# Altium footprint library NinjaPCB.PcbLib: 20 footprints (part 1 of 2)
Each footprint in its own frame and in the unit in brackets; x right, y up, seen from the top. Pads: shape width x height; smd on the part's side, far side on the other; paste and mask are expansions set on the pad; w line width, h text height; cw(c..) or ccw(c..) is an arc to the next point about the centre after c.
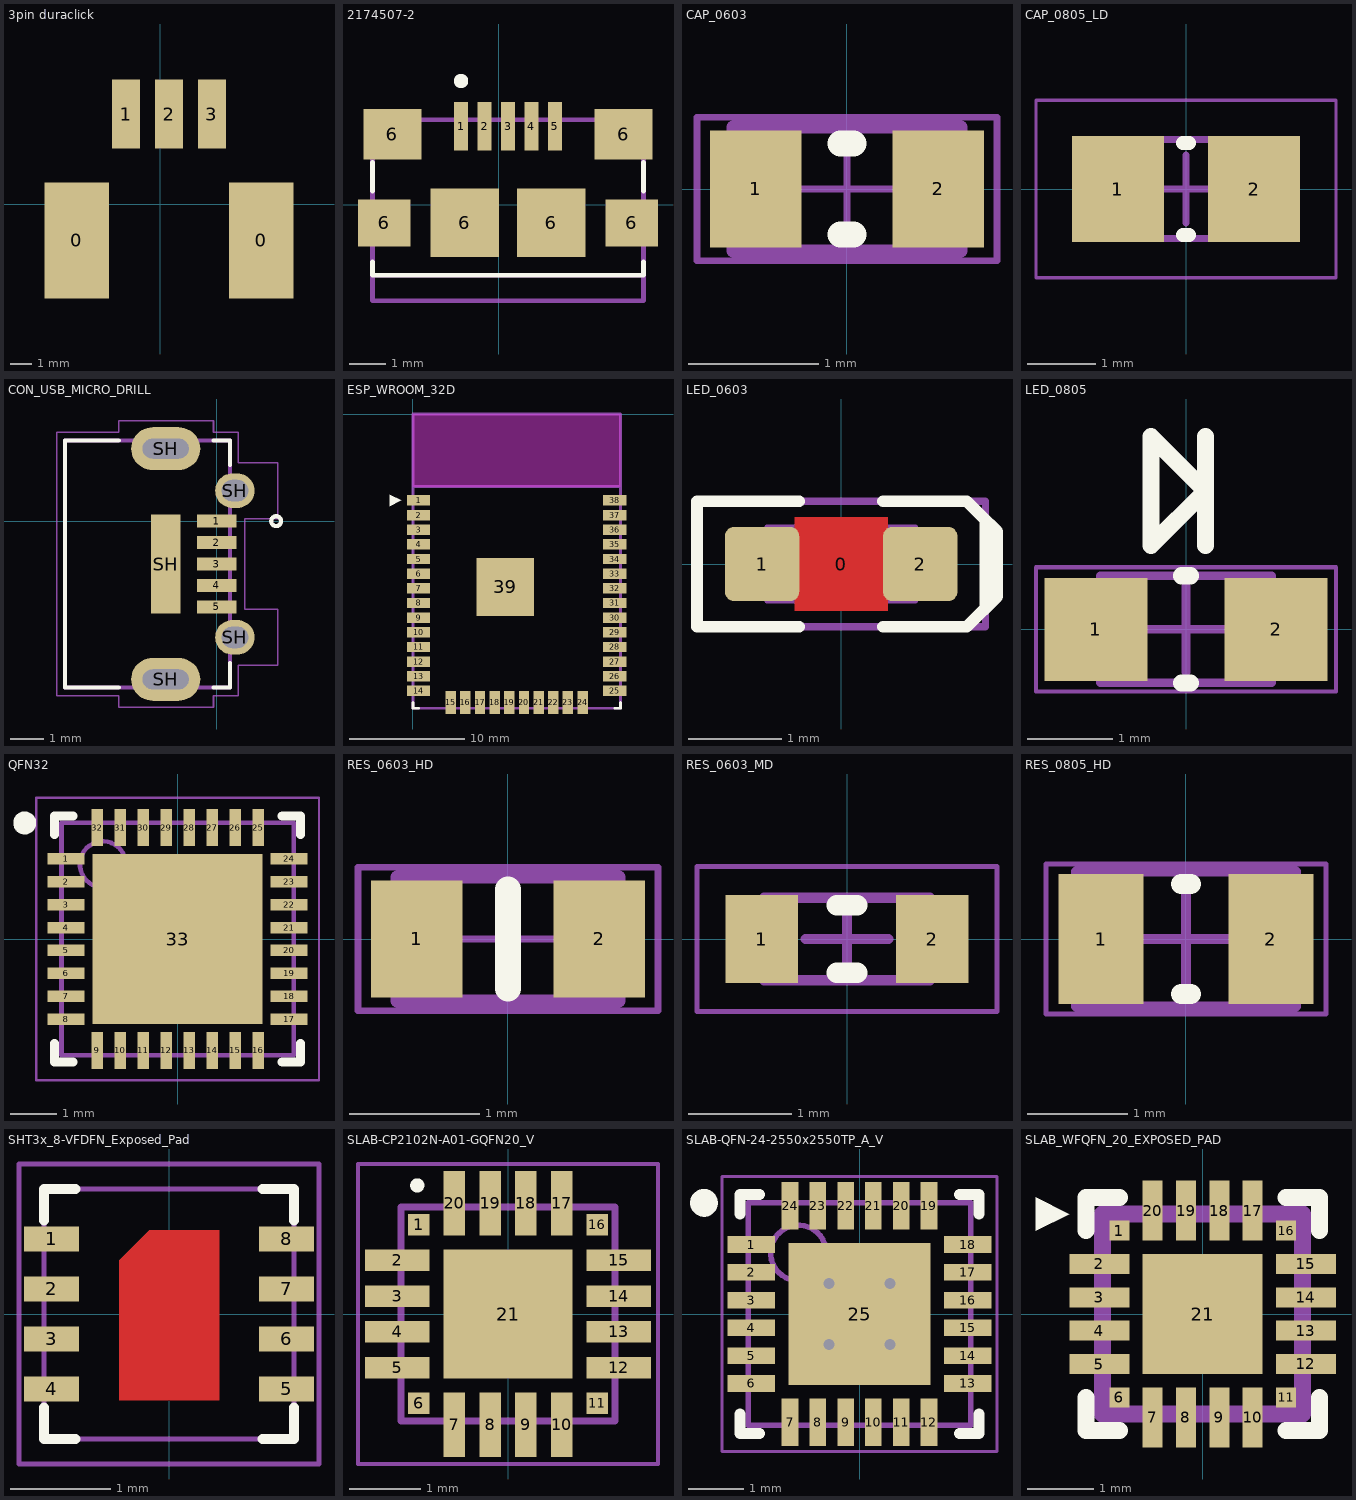
[diagram p0: the footprints below, top view; thin cyan lines are the x and y axes]

## 3pin duraclick [mm] "3pin molex duraclick system, black"
pads (5):
  rect 3x5.4 smd: 0(-3.9,-1.7) 0(4.7,-1.7)
  rect 1.3x3.2 smd: 1(-1.6,4.2) 2(0.4,4.2) 3(2.4,4.2)
3D body "3pin.stp": height 6.35, standoff -0.05, extent -4.6,-4.2 5.4,5.2

## 2174507-2 [mm]
pads (11):
  rect 0.4x1.35 smd: 1(-1.046,2.167) 2(-0.396,2.167) 3(0.254,2.167) 4(0.904,2.167) 5(1.554,2.167)
  rect 1.45x1.3 smd: 6(-3.171,-0.508) 6(3.679,-0.508)
  rect 1.6x1.4 smd: 6(-2.946,1.942) 6(3.454,1.942)
  rect 1.9x1.9 smd: 6(-0.946,-0.508) 6(1.454,-0.508)
Top Overlay:
  circle w0.2: c-1.046,3.417 r0.1
  lines w0.127: -3.496,-1.583 -3.496,-1.958 4.004,-1.958 4.004,-1.583 ; -3.496,0.367 -3.496,1.167 ; 4.004,0.367 4.004,1.167
Mechanical 1:
  lines w0.127: -3.496,-1.958 4.004,-1.958 ; -3.496,-1.958 -3.496,2.342 4.004,2.342 4.004,-1.958 ; -3.496,-1.958 -3.496,-2.658 4.004,-2.658 4.004,-1.958
  text "PCB EDGE" at -0.652,-2.128 h1.88
3D body "2174507-2.stp": height 2.68, standoff -0.02, extent -3.671,-2.642 4.129,2.358

## CAP_0603 [mm] "Ceramic"
pads (2):
  rect 0.7x0.9 smd: 1(-0.7,0) 2(0.7,0)
Top Overlay:
  lines w0.2: -0.05,-0.35 0.05,-0.35 ; -0.05,0.35 0.05,0.35
Top:
  lines w0.1: -0.875,-0.475 -0.875,0.475 0.875,0.475 0.875,-0.475 -0.875,-0.475
Mechanical 15:
  lines w0.05: -0.475,0 0.475,0 ; 0,-0.475 0,0.475 ; -1.15,-0.55 -1.15,0.55 1.15,0.55 1.15,-0.55 -1.15,-0.55
3D body "cap_0603_lowprofile.step": height 0.6, standoff 0, extent -0.8,-0.4 0.8,0.4

## CAP_0805_LD [mm] "Chip Capacitor, Body 2.0x1.2mm, Height 1.0mm, IPC Low Density"
height 1
pads (2):
  rect 1.35x1.55 smd: 1(-1,0) 2(1,0)
Top Overlay:
  lines w0.2: -0.05,-0.675 0.05,-0.675 ; -0.05,0.675 0.05,0.675
Top:
  lines w0.1: -1.1,-0.725 -1.1,0.725 1.1,0.725 1.1,-0.725 -1.1,-0.725
Mechanical 15:
  lines w0.05: -2.2,-1.3 -2.2,1.3 2.2,1.3 2.2,-1.3 -2.2,-1.3
  lines w0.1: -0.5,0 0.5,0 ; 0,-0.5 0,0.5
3D body: height 1, standoff 0, extent -0.6,-0.725 0.6,0.725
3D body: height 1, standoff 0, extent -1.1,-0.725 -0.6,0.725
3D body: height 1, standoff 0, extent 0.6,-0.725 1.1,0.725

## CON_USB_MICRO_DRILL [mm] "UJ2-MIBH2-4-SMT"
height 2.45
pads (10):
  rect 1.2x0.4 smd: 1(0,0) 2(0,-0.65) 3(0,-1.3) 4(0,-1.95) 5(0,-2.6)
  oval 2.1x1.3 hole 0.6 slot 1.4 at 0 deg: SH(-1.55,-4.8) SH(-1.55,2.2)
  rect 0.9x3 smd: SH(-1.55,-1.3)
  oval 1.2x1.05 hole 0.65 slot 0.8 at 0 deg: SH(0.55,-3.525) SH(0.55,0.925)
Top Overlay:
  circle w0.127: c1.8,0 r0.15
  lines w0.127: -2.975,-5.05 -4.6,-5.05 -4.6,2.45 -2.975,2.45 ; -0.1,-5.05 0.4,-5.05 0.4,-4.3 ; -0.1,2.45 0.4,2.45 0.4,1.7
Mechanical 1:
  circle w0.16: c-0.15,0 r0.08
  lines w0.127: -4.6,-5.05 0.4,-5.05 0.4,2.45 -4.6,2.45 -4.6,-5.05
Mechanical 4:
  lines w0: -1.95,-5.1 cw(c-1.95,-4.8) -1.95,-4.5 -1.15,-4.5 cw(c-1.15,-4.8) -1.15,-5.1 -1.95,-5.1 ; -1.95,1.9 cw(c-1.95,2.2) -1.95,2.5 -1.15,2.5 cw(c-1.15,2.2) -1.15,1.9 -1.95,1.9
  lines w0.001: 0.55,-3.851 0.624,-3.851 ccw(c0.624,-3.525) 0.95,-3.525 ccw(c0.625,-3.525) 0.625,-3.2 0.55,-3.2 ; 0.55,-3.85 0.475,-3.85 cw(c0.475,-3.525) 0.15,-3.525 cw(c0.476,-3.525) 0.476,-3.199 0.55,-3.2 ; 0.55,1.25 0.625,1.25 cw(c0.625,0.925) 0.95,0.925 cw(c0.624,0.925) 0.624,0.599 0.55,0.6 0.475,0.6 cw(c0.475,0.925) 0.15,0.925 cw(c0.476,0.925) 0.476,1.251 0.55,1.251
  lines w0.05: -4.85,-5.3 -2.975,-5.3 -2.975,-5.65 -0.1,-5.65 -0.1,-5.3 0.65,-5.3 0.65,-4.375 1.85,-4.375 1.85,-2.675 0.85,-2.675 0.85,0.075 1.85,0.075 1.85,1.775 0.65,1.775 0.65,2.7 -0.1,2.7 -0.1,3.05 -2.975,3.05 -2.975,2.7 -4.85,2.7 -4.85,-5.3
3D body "uj2-mibh2-4-smt.stp": height 2.81, standoff -0.6, extent -4.623,-5.045 0.672,2.455

## ESP_WROOM_32D [mm] "ESP32 SoM"
pads (39):
  rect 2x0.9 smd: 1(0.5,-7.49) 2(0.5,-8.76) 3(0.5,-10.03) 4(0.5,-11.3) 5(0.5,-12.57) 6(0.5,-13.84) 7(0.5,-15.11) 8(0.5,-16.38) 9(0.5,-17.65) 10(0.5,-18.92) 11(0.5,-20.19) 12(0.5,-21.46) 13(0.5,-22.73) 14(0.5,-24) 25(17.5,-24) 26(17.5,-22.73) 27(17.5,-21.46) 28(17.5,-20.19) 29(17.5,-18.92) 30(17.5,-17.65) 31(17.5,-16.38) 32(17.5,-15.11) 33(17.5,-13.84) 34(17.5,-12.57) 35(17.5,-11.3) 36(17.5,-10.03) 37(17.5,-8.76) 38(17.5,-7.49)
  rect 0.9x2 smd: 15(3.285,-25) 16(4.555,-25) 17(5.825,-25) 18(7.095,-25) 19(8.365,-25) 20(9.635,-25) 21(10.905,-25) 22(12.175,-25) 23(13.445,-25) 24(14.715,-25)
  rect 5x5 smd: 39(8,-14.99)
Top Overlay:
  region: -1,-7.49 -2,-6.99 -2,-7.99
  lines w0.254: 0,-25 0,-25.5 0.5,-25.5 ; 17.5,-25.5 18,-25.5 18,-25
Keep-Out Layer:
  region: 0,0 18,0 18,-6.3 0,-6.3
Top:
  lines w0.254: 0,0 18,0 18,-6.3 ; 0,0 0,-6.3 18,-6.3 ; 0,0 0,-25.5 18,-25.5 18,-6.3
3D body "ESP321.SLDPRT": height 2.91, standoff -0.01, extent 0,-25.5 18,0

## LED_0603 [mm]
height 0.8
pads (3):
  round 0.254 on Mech14: 0(0,0)
  rrect25% 0.8x0.8 smd: 1(-0.85,0) 2(0.85,0)
Top Layer:
  pour cut-out: -0.5,0.5 0.5,0.5 0.5,-0.5 -0.5,-0.5
Top Overlay:
  lines w0.127: -0.45,-0.675 -1.55,-0.675 -1.55,0.675 -0.45,0.675 ; 0.45,-0.675 1.35,-0.675 1.55,-0.475 1.55,0.475 1.35,0.675 0.45,0.675 ; 1.5,0.525 1.675,0.35 1.675,-0.35 1.525,-0.5
Top:
  lines w0.05: -0.6,-0.4 -0.6,0.399 0.6,0.4 0.6,-0.4 -0.6,-0.399 ; -0.505,-0.398 -0.505,0.398 ; -0.5,-0.4 -0.8,-0.4 -0.8,0.4 -0.5,0.4 ; 0.5,-0.4 0.8,-0.4 0.8,0.4 0.5,0.4 ; 0.505,-0.398 0.505,0.398 ; -0.599,-0.398 0.599,-0.398 0.599,0.398 -0.599,0.398 -0.599,-0.398
Bottom:
  lines w0.076: -1.55,-0.675 -1.55,0.675 1.55,0.675 1.55,-0.675 -1.55,-0.675
3D body "LED 0603 APT1608 RED.STEP": height 0.75, standoff 0, extent -0.8,-0.4 0.8,0.4

## LED_0805 [mm] "SMD, 2-Leads, Body 2x1.25mm"
height 0.8
pads (2):
  rect 1.2x1.2 smd: 1(-1.05,0) 2(1.05,0)
Top Overlay:
  lines w0.2: -0.051,-0.625 0.051,-0.625 ; -0.051,0.625 0.051,0.625 ; 0.227,0.98 0.227,2.25 ; -0.408,0.98 0.227,1.615 -0.408,2.25 -0.408,0.98
Top:
  lines w0.1: -0.7,-0.625 -0.7,0.625 ; 0.7,-0.625 0.7,0.625 ; -1,-0.625 -1,0.625 1,0.625 1,-0.625 -1,-0.625
Mechanical 15:
  lines w0.05: -1.75,-0.725 1.75,-0.725 1.75,0.725 -1.75,0.725 -1.75,-0.725
  lines w0.1: -0.5,0 0.5,0 ; 0,-0.5 0,0.5
3D body: height 0.3, standoff 0, extent -1,-0.625 1,0.625
3D body: height 0.8, standoff 0, extent -0.7,-0.625 0.7,0.625

## QFN32 [mm] "QFN, 32-Leads, Body 5,00x5,00mm, Pitch 0,50mm, Thermal Pad 3,70x3,70mm, IPC Medium Density"
height 0.9
pads (33):
  rect 0.8x0.25 smd: 1(-2.425,1.75) 2(-2.425,1.25) 3(-2.425,0.75) 4(-2.425,0.25) 5(-2.425,-0.25) 6(-2.425,-0.75) 7(-2.425,-1.25) 8(-2.425,-1.75) 17(2.425,-1.75) 18(2.425,-1.25) 19(2.425,-0.75) 20(2.425,-0.25) 21(2.425,0.25) 22(2.425,0.75) 23(2.425,1.25) 24(2.425,1.75)
  rect 0.25x0.8 smd: 9(-1.75,-2.425) 10(-1.25,-2.425) 11(-0.75,-2.425) 12(-0.25,-2.425) 13(0.25,-2.425) 14(0.75,-2.425) 15(1.25,-2.425) 16(1.75,-2.425) 25(1.75,2.425) 26(1.25,2.425) 27(0.75,2.425) 28(0.25,2.425) 29(-0.25,2.425) 30(-0.75,2.425) 31(-1.25,2.425) 32(-1.75,2.425)
  rect 3.7x3.7 smd: 33(0,0)
Top Overlay:
  circle w0.25: c-3.325,2.525 r0.125
  lines w0.2: -2.675,-2.275 -2.675,-2.675 -2.275,-2.675 ; -2.675,2.275 -2.675,2.675 -2.275,2.675 ; 2.275,-2.675 2.675,-2.675 2.675,-2.275 ; 2.275,2.675 2.675,2.675 2.675,2.275
Top:
  circle w0.1: c-1.625,1.625 r0.5
  lines w0.1: -2.525,-2.525 -2.525,2.525 2.525,2.525 2.525,-2.525 -2.525,-2.525
Mechanical 15:
  lines w0.05: -3.075,-3.075 -3.075,3.075 3.075,3.075 3.075,-3.075 -3.075,-3.075
  lines w0.1: -0.5,0 0.5,0 ; 0,-0.5 0,0.5
3D body "QFN32.step": height 0.9, standoff 0, extent -2.526,-2.526 2.526,2.526

## RES_0603_HD [mm] "Chip Resistor, Body 1.6x0.8mm, IPC High Density"
height 0.6
pads (2):
  rect 0.7x0.9 smd: 1(-0.7,0) 2(0.7,0)
Top Overlay:
  lines w0.2: 0,-0.381 0,0.381
Top:
  lines w0.1: -0.85,-0.475 0.85,-0.475 0.85,0.475 -0.85,0.475 -0.85,-0.475
Mechanical 15:
  lines w0.05: -0.475,0 0.475,0 ; 0,-0.475 0,0.475 ; -1.15,-0.55 1.15,-0.55 1.15,0.55 -1.15,0.55 -1.15,-0.55
3D body "0603 SMD resistor.step": height 0.41, standoff 0.01, extent -0.8,-0.4 0.8,0.4

## RES_0603_MD [mm] "Chip Resistor, 2-Leads, Body 1,60x0,80mm, IPC Medium Density"
height 0.5
pads (2):
  rect 0.7x0.85 smd: 1(-0.825,0) 2(0.825,0)
Top Overlay:
  lines w0.2: -0.1,-0.325 0.1,-0.325 ; -0.1,0.325 0.1,0.325
Top:
  lines w0.1: -0.8,-0.4 0.8,-0.4 0.8,0.4 -0.8,0.4 -0.8,-0.4
Mechanical 15:
  lines w0.05: -1.45,-0.7 1.45,-0.7 1.45,0.7 -1.45,0.7 -1.45,-0.7
  lines w0.1: -0.4,0 0.4,0 ; 0,-0.4 0,0.4
3D body "RESC1608X05N.step": height 0.5, standoff 0, extent -0.8,-0.4 0.8,0.4

## RES_0805_HD [mm] "Chip Resistor, Body 2.0x1.3mm, IPC High Density"
height 0.7
pads (2):
  rect 0.85x1.3 smd: 1(-0.85,0) 2(0.85,0)
Top Overlay:
  lines w0.2: -0.05,-0.55 0.05,-0.55 ; -0.05,0.55 0.05,0.55
Top:
  lines w0.1: -1.1,-0.675 -1.1,0.675 1.1,0.675 1.1,-0.675 -1.1,-0.675
Mechanical 15:
  lines w0.05: -1.4,-0.75 -1.4,0.75 1.4,0.75 1.4,-0.75 -1.4,-0.75
  lines w0.1: -0.5,0 0.5,0 ; 0,-0.5 0,0.5
3D body: height 0.7, standoff 0, extent -1.1,-0.675 -0.68,0.675
3D body: height 0.7, standoff 0, extent -0.68,-0.675 0.68,0.675
3D body: height 0.7, standoff 0, extent 0.68,-0.675 1.1,0.675

## SHT3x_8-VFDFN_Exposed_Pad [mm] "Sensirion SHT3x 8-DFN"
pads (8):
  rect 0.55x0.25 smd: 1(-1.175,0.75) 2(-1.175,0.25) 3(-1.175,-0.25) 4(-1.175,-0.75) 5(1.175,-0.75) 6(1.175,-0.25) 7(1.175,0.25) 8(1.175,0.75)
Top Layer:
  region: -0.5,0.537 -0.5,-0.863 0.5,-0.863 0.5,0.838 -0.2,0.838
Top Overlay:
  lines w0.1: -1.25,-0.937 -1.25,-1.25 -0.937,-1.25 ; -1.25,0.937 -1.25,1.25 -0.937,1.25 ; 0.937,-1.25 1.25,-1.25 1.25,-0.937 ; 0.937,1.25 1.25,1.25 1.25,0.937
Top:
  lines w0.05: -1.25,-1.25 1.25,-1.25 1.25,1.25 -1.25,1.25 -1.25,-1.25
Mechanical 15:
  lines w0.05: -0.25,0 0,0 ; 0,-0.25 0,0 ; 0,0.25 0,0 ; 0.25,0 0,0 ; -1.5,-1.5 1.5,-1.5 1.5,1.5 -1.5,1.5 -1.5,-1.5
3D body "User Library-SHT3x.STEP": height 0.9, standoff -0.01, extent -1.26,-1.25 1.26,1.25

## SLAB-CP2102N-A01-GQFN20_V [mm] "QFN, 20-Leads, Body 3x3mm, Pitch 0.5mm, Thermal Pad 1.8x1.8mm"
height 0.8
pads (21):
  rect 0.3x0.3 smd: 1(-1.25,1.25) 6(-1.25,-1.25) 11(1.25,-1.25) 16(1.25,1.25)
  rect 0.9x0.3 smd: 2(-1.55,0.75) 3(-1.55,0.25) 4(-1.55,-0.25) 5(-1.55,-0.75) 12(1.55,-0.75) 13(1.55,-0.25) 14(1.55,0.25) 15(1.55,0.75)
  rect 0.3x0.9 smd: 7(-0.75,-1.55) 8(-0.25,-1.55) 9(0.25,-1.55) 10(0.75,-1.55) 17(0.75,1.55) 18(0.25,1.55) 19(-0.25,1.55) 20(-0.75,1.55)
  rect 1.8x1.8 smd: 21(0,0)
Top Overlay:
  circle w0.1: c-1.27,1.8 r0.05
Top:
  lines w0.1: -1.5,-1.5 -1.5,1.5 1.5,1.5 1.5,-1.5 -1.5,-1.5
Mechanical 15:
  lines w0.05: -2.1,-2.1 -2.1,2.1 2.1,2.1 2.1,-2.1 -2.1,-2.1
  lines w0.1: -0.5,0 0.5,0 ; 0,-0.5 0,0.5
3D body: height 0.8, standoff 0, extent -1.5,-1.5 1.5,1.5

## SLAB-QFN-24-2550x2550TP_A_V [mm] "QFN, 6-Leads, Body 4x4mm, Pitch 0.5mm, Thermal Pad 2.55x2.55mm"
height 0.8
pads (25):
  rect 0.85x0.3 smd: 1(-1.95,1.25) 2(-1.95,0.75) 3(-1.95,0.25) 4(-1.95,-0.25) 5(-1.95,-0.75) 6(-1.95,-1.25) 13(1.95,-1.25) 14(1.95,-0.75) 15(1.95,-0.25) 16(1.95,0.25) 17(1.95,0.75) 18(1.95,1.25)
  rect 0.3x0.85 smd: 7(-1.25,-1.95) 8(-0.75,-1.95) 9(-0.25,-1.95) 10(0.25,-1.95) 11(0.75,-1.95) 12(1.25,-1.95) 19(1.25,1.95) 20(0.75,1.95) 21(0.25,1.95) 22(-0.25,1.95) 23(-0.75,1.95) 24(-1.25,1.95)
  rect 2.55x2.55 smd: 25(0,0)
via -0.55,0.55 diameter 0.5 hole 0.2
via 0.55,0.55 diameter 0.5 hole 0.2
via -0.55,-0.55 diameter 0.5 hole 0.2
via 0.55,-0.55 diameter 0.5 hole 0.2
Top Overlay:
  circle w0.25: c-2.8,2 r0.125
  lines w0.2: -2.15,-1.8 -2.15,-2.15 -1.8,-2.15 ; -2.15,1.8 -2.15,2.15 -1.8,2.15 ; 1.8,-2.15 2.15,-2.15 2.15,-1.8 ; 1.8,2.15 2.15,2.15 2.15,1.8
Top:
  circle w0.1: c-1.1,1.1 r0.5
  lines w0.1: -2,-2 -2,2 2,2 2,-2 -2,-2
Mechanical 15:
  lines w0.05: -2.475,-2.475 -2.475,2.475 2.475,2.475 2.475,-2.475 -2.475,-2.475
  lines w0.1: -0.5,0 0.5,0 ; 0,-0.5 0,0.5
3D body "QFN50P400X400X80_HS-25L.step": height 0.8, standoff 0, extent -2.001,-2.001 2.001,2.001

## SLAB_WFQFN_20_EXPOSED_PAD [mm] "Weird QFN20 by SLAB -  IPC-7351"
pads (21):
  rect 0.3x0.3 smd: 1(-1.25,1.25) 6(-1.25,-1.25) 11(1.25,-1.25) 16(1.25,1.25)
  rect 0.9x0.3 smd: 2(-1.55,0.75) 3(-1.55,0.25) 4(-1.55,-0.25) 5(-1.55,-0.75) 12(1.55,-0.75) 13(1.55,-0.25) 14(1.55,0.25) 15(1.55,0.75)
  rect 0.3x0.9 smd: 7(-0.75,-1.55) 8(-0.25,-1.55) 9(0.25,-1.55) 10(0.75,-1.55) 17(0.75,1.55) 18(0.25,1.55) 19(-0.25,1.55) 20(-0.75,1.55)
  rect 1.8x1.8 smd: 21(0,0)
Top Overlay:
  region: -1.875,1.875
  region: -2.5,1.25 -2.5,1.75 -2.25,1.5 -2.5,1.75 -2,1.5
  lines w0.254: -1.75,-1.25 -1.75,-1.75 -1.25,-1.75 ; -1.75,1.25 -1.75,1.75 -1.25,1.75 ; 1.25,-1.75 1.75,-1.75 1.75,-1.25 ; 1.25,1.75 1.75,1.75 1.75,1.25
Top:
  lines w0.254: -1.5,-1.5 -1.5,1.5 1.5,1.5 1.5,-1.5 -1.5,-1.5
3D body "User Library-VQFN-20 3x3 0_45mm v2.STEP": height 0.85, standoff -0.01, extent -1.5,-1.51 1.5,1.49